# Altium footprint library Library 3D.PcbLib: 288 footprints (part 11 of 18)
Each footprint in its own frame and in the unit in brackets; x right, y up, seen from the top. Pads: shape width x height; smd on the part's side, far side on the other; paste and mask are expansions set on the pad; w line width, h text height; cw(c..) or ccw(c..) is an arc to the next point about the centre after c.
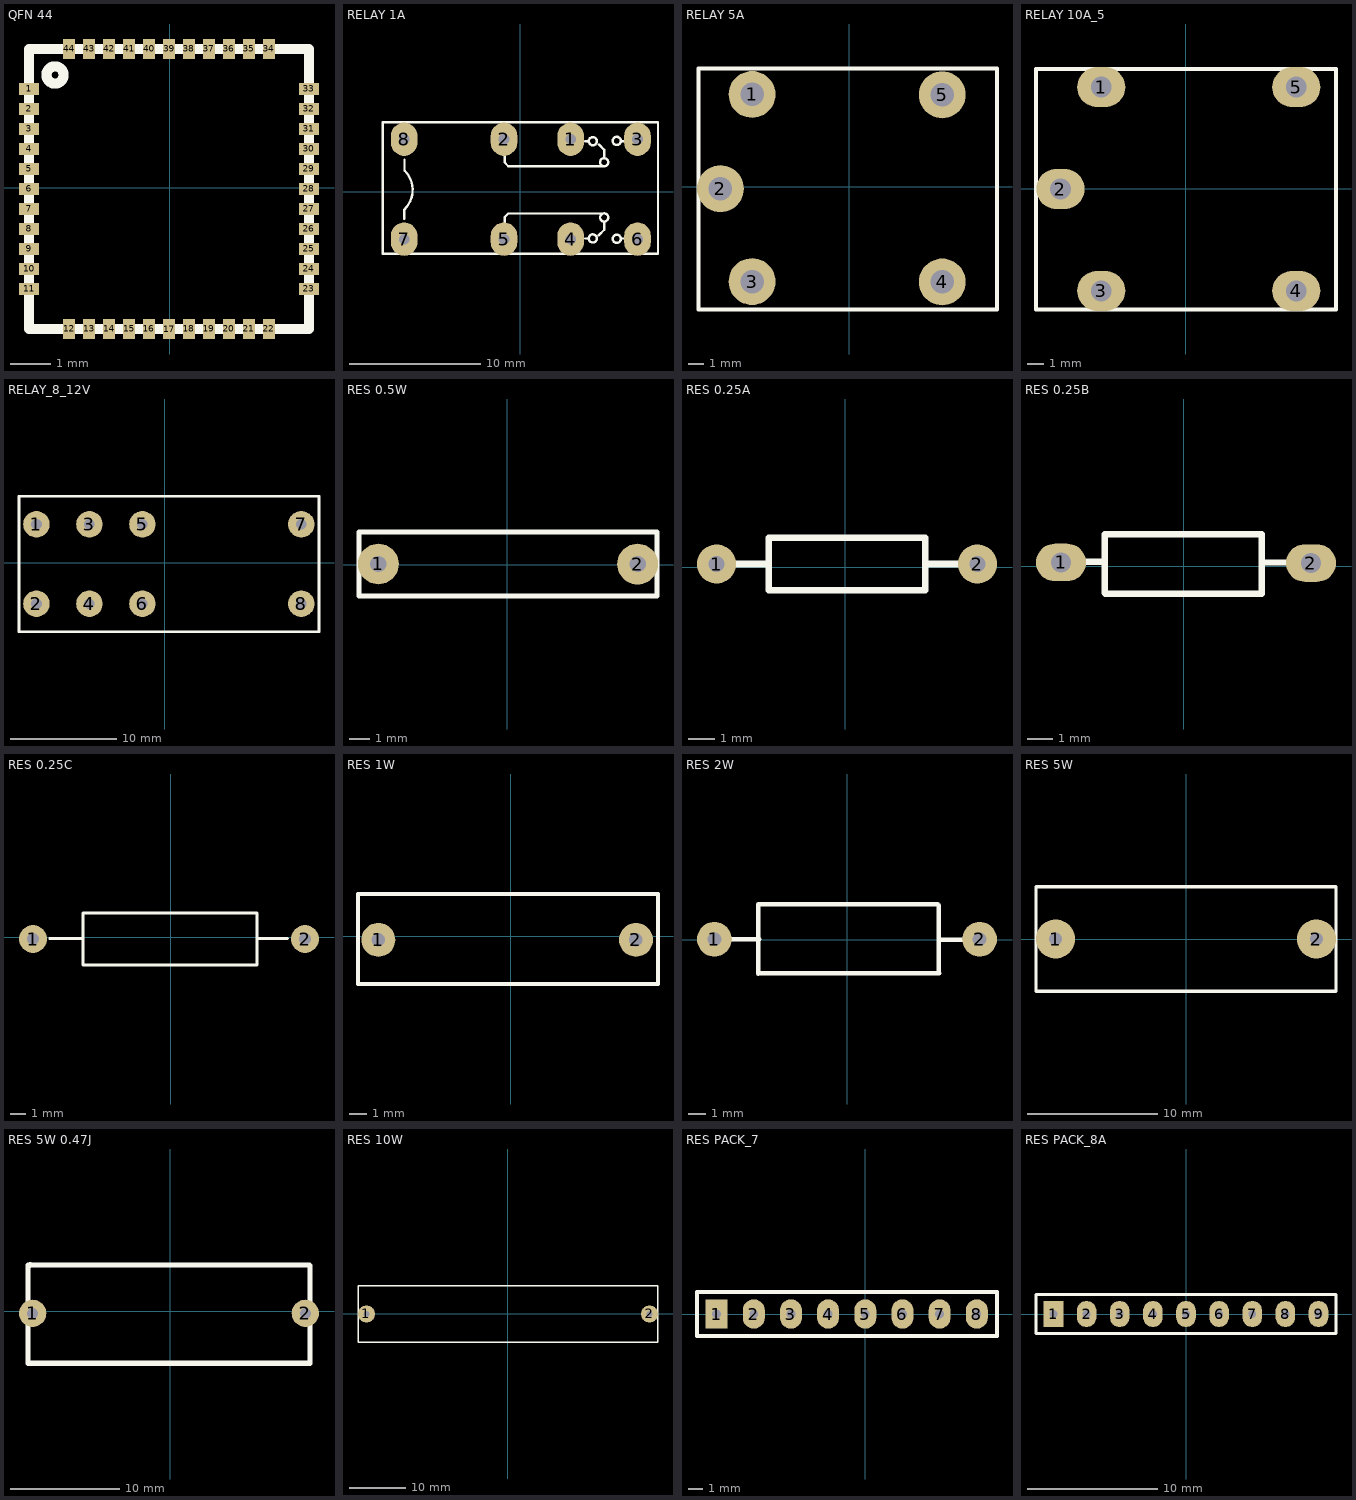
[diagram p10: the footprints below, top view; thin cyan lines are the x and y axes]

## QFN 44 [mm]
pads (44):
  rect 0.5x0.3 smd: 1(-3.525,2.475) 2(-3.525,1.975) 3(-3.525,1.475) 4(-3.525,0.975) 5(-3.525,0.475) 6(-3.525,-0.025) 7(-3.525,-0.525) 8(-3.525,-1.025) 9(-3.525,-1.525) 10(-3.525,-2.025) 11(-3.525,-2.525) 23(3.475,-2.525) 24(3.475,-2.025) 25(3.475,-1.525) 26(3.475,-1.025) 27(3.475,-0.525) 28(3.475,-0.025) 29(3.475,0.475) 30(3.475,0.975) 31(3.475,1.475) 32(3.475,1.975) 33(3.475,2.475)
  rect 0.3x0.5 smd: 12(-2.525,-3.524) 13(-2.025,-3.524) 14(-1.525,-3.525) 15(-1.025,-3.524) 16(-0.525,-3.524) 17(-0.024,-3.527) 18(0.475,-3.525) 19(0.975,-3.525) 20(1.475,-3.525) 21(1.975,-3.525) 22(2.475,-3.525) 34(2.475,3.475) 35(1.975,3.475) 36(1.475,3.475) 37(0.975,3.475) 38(0.475,3.475) 39(-0.024,3.475) 40(-0.525,3.475) 41(-1.025,3.475) 42(-1.525,3.475) 43(-2.025,3.475) 44(-2.525,3.475)
Top Overlay:
  circle w0.254: c-2.875,2.825 r0.215
  lines w0.254: -3.525,-3.527 3.477,-3.527 3.477,3.475 -3.525,3.475 -3.525,-3.527
3D body "User Library-smd_qfn-44-2.STEP": height 0.9, standoff 0, extent -3.525,-3.527 3.477,3.475

## RELAY 1A [mil]
pads (8):
  oval 80x100 hole 32: 1(150.87,157.83) 2(-49.13,157.83) 3(351.87,157.83) 4(150.87,-142.17) 5(-49.13,-142.17) 6(351.87,-142.17) 7(-349.13,-142.17) 8(-349.13,157.83)
Top Overlay:
  circle w7: c289.63,152.83 r12.24
  circle w7: c217.63,151.83 r12.24
  circle w7: c251.63,88.83 r12.24
  circle w7: c251.63,-77.17 r12.24
  circle w7: c217.63,-140.17 r12.24
  circle w7: c289.63,-141.17 r12.24
  lines w7: -349.13,-81.17 -349.13,-54.17 ; -348.13,-53.17 ccw(c-405.63,5.33) -347.13,62.83 ; -348.13,63.83 -348.13,96.83 ; -47.13,-97.17 -47.13,-76.17 -36.13,-65.17 249.87,-65.17 ; -47.13,115.83 -47.13,87.83 -36.13,76.83 249.87,76.83 ; 194.87,-140.17 202.87,-140.17 ; 194.87,151.83 202.87,151.83 ; 235.87,-130.17 251.87,-114.17 251.87,-91.17 ; 235.87,141.83 251.87,125.83 251.87,102.83 ; 303.87,-140.17 308.87,-140.17 ; 303.87,151.83 308.87,151.83 ; -413.39,-186.02 413.39,-186.02 413.39,208.83 -413.39,208.83 -413.39,-186.02
3D body "SW3dPS-DSY2Y.STEP": height 484.25, standoff -118.11, extent -408.58,-182.17 410.31,203.66

## RELAY 5A [mm]
pads (5):
  round 3 hole 1.5: 1(-6.225,5.9) 2(-8.25,-0.125) 3(-6.225,-6.075) 4(5.95,-6.1) 5(5.95,5.875)
Top Overlay:
  lines w0.254: -9.65,-7.875 9.45,-7.875 9.45,7.575 -9.65,7.575 -9.65,-7.875
3D body "User Library-SONGLE Relay SRU-12VDC-SL-C.STEP": height 15.3, standoff -5, extent -9.65,-7.875 9.45,7.625

## RELAY 10A_5 [mm]
pads (5):
  oval 3x2.5 hole 1.3: 1(-5.263,6.341) 2(-7.803,-0.009) 3(-5.263,-6.359) 4(6.897,-6.359) 5(6.897,6.341)
Top Overlay:
  lines w0.254: -9.327,-7.516 9.373,-7.516 9.373,7.484 -9.327,7.484 -9.327,-7.516
3D body: height 16, standoff 0, extent -9.327,-7.502 9.342,7.484

## RELAY_8_12V [mm]
pads (8):
  round 2.5 hole 1: 1(-12.125,3.625) 2(-12.125,-3.875) 3(-7.125,3.625) 4(-7.125,-3.875) 5(-2.125,3.625) 6(-2.125,-3.875) 7(12.875,3.625) 8(12.875,-3.875)
Top Overlay:
  lines w0.254: -13.775,-6.525 14.55,-6.525 14.55,6.275 -13.775,6.275 -13.775,-6.525
3D body "Relay8_12V.STEP": height 24.92, standoff -4.38, extent -13.625,-6.375 14.375,6.125

## RES 0.5W [mm]
pads (2):
  round 2 hole 0.8: 1(-6.325,0.025) 2(6.375,0.021)
Top Overlay:
  lines w0.254: -7.275,-1.55 7.325,-1.55 7.325,1.6 -7.275,1.6 -7.275,-1.55
3D body "User Library-Resistencia 0_5.STEP": height 3.1, standoff -1.5, extent -6.706,-1.407 6.756,1.45

## RES 0.25A [mm]
pads (2):
  round 1.5 hole 0.6: 1(-4.925,0.125) 2(5.075,0.125)
Top Overlay:
  lines w0.254: -4.925,0.125 -2.925,0.125 ; 3.075,0.125 5.075,0.125 ; -2.925,-0.875 -2.925,1.125 3.075,1.125 3.075,-0.875 -2.925,-0.875
3D body "R 0.25W.STEP": height 7.8, standoff -3.5, extent -5.225,-1.185 5.375,1.425

## RES 0.25B [mm]
pads (2):
  oval 2x1.5 hole 0.8: 1(-4.9,0.15) 2(5.1,0.125)
Top Overlay:
  lines w0.254: -4.525,0.175 -3.15,0.175 ; 3.187,0.15 4.7,0.15 ; -3.15,-1.075 -3.125,-1.1 3.125,-1.1 3.125,1.275 -3.15,1.275 -3.15,-1.075
3D body "SW3dPS-AXIAL_RESISTOR(0.25W).STEP": height 2.6, standoff -1.5, extent -5.295,-1.1 5.505,1.3

## RES 0.25C [mil]
pads (2):
  round 70 hole 31: 1(-344.13,-4.72) 2(335.87,-4.72)
Top Overlay:
  lines w7: -302.13,-3.72 -219.13,-3.72 ; 215.87,-3.72 291.87,-3.72 ; -219.13,-69.72 215.87,-69.72 215.87,60.28 -219.13,60.28 -219.13,-69.72
3D body "SW3dPS-Resistor 5-band.STEP": height 142, standoff -125, extent -354.88,-69.72 346.62,62.28

## RES 1W [mm]
pads (2):
  round 2 hole 0.8: 1(-7.8,-0.2) 2(7.4,-0.2)
Top Overlay:
  lines w0.254: -9,-2.8 -9,2.5 8.7,2.5 8.7,-2.8 -9,-2.8
3D body "User Library-RES-1W.STEP": height 5, standoff -3, extent -8.15,-2.703 7.79,2.297

## RES 2W [mm]
pads (2):
  round 2 hole 0.8: 1(-7.65,0.025) 2(7.6,0.025)
Top Overlay:
  lines w0.254: -6.975,0.025 -5.075,0.025 ; 5.3,0 6.725,0 ; -5.125,-1.95 -5.125,2.025 5.2,2.025 5.25,1.975 5.25,-1.9 5.275,-1.925 -5.1,-1.925 -5.125,-1.95
3D body "User Library-Resistor_Carvao_2W.STEP": height 5, standoff -3, extent -8.045,-1.975 7.995,2.025

## RES 5W [mm]
pads (2):
  round 3 hole 1: 1(-10,0) 2(10,0)
Top Overlay:
  lines w0.254: -11.5,-4 -11.5,4 11.5,4 11.5,-4 -11.5,-4
3D body "User Library-Resistor_PTH_AC05_Vishay_5W.STEP": height 7.5, standoff -2.6, extent -10.4,-3.75 10.4,3.75

## RES 5W 0.47J [mm]
pads (2):
  round 2.5 hole 1: 1(-12.625,-0.2) 2(12.375,-0.2)
Top Overlay:
  lines w0.5: -13.021,4.232 12.718,4.232 12.8,4.15 12.8,-4.747 12.779,-4.768 -13.05,-4.768 -13.05,4.05 -12.85,4.25
3D body "Trodrhdh.STEP": height 9.21, standoff -5.33, extent -13.021,-4.768 12.779,4.232

## RES 10W [mm]
pads (2):
  round 3 hole 1: 1(-25,0) 2(25,0)
Top Overlay:
  lines w0.254: -26.5,-5 -26.5,5 26.5,5 26.5,-5 26,-5 -26.5,-5
3D body "User Library-Resistor_PTH_RS010_Vishay_10W.STEP": height 9.53, standoff -2.6, extent -25.5,-4.765 25.5,4.765

## RES PACK_7 [mm]
pads (8):
  rect 1.5x2 hole 0.6: 1(-10.16,0)
  oval 1.5x2 hole 0.6: 2(-7.62,0) 3(-5.08,0) 4(-2.54,0) 5(0,0) 6(2.54,0) 7(5.08,0) 8(7.62,0)
Top Overlay:
  lines w0.254: -11.5,-1.5 -11.5,1.5 9,1.5 9,-1.5 -11.5,-1.5
3D body "User Library-4600H Series (Bourns).STEP": height 9.01, standoff -3.18, extent -11.354,-1.245 8.916,1.245

## RES PACK_8A [mm]
pads (9):
  rect 1.5x2 hole 0.6: 1(-10.16,0)
  oval 1.5x2 hole 0.6: 2(-7.62,0) 3(-5.08,0) 4(-2.54,0) 5(0,0) 6(2.54,0) 7(5.08,0) 8(7.62,0) 9(10.16,0)
Top Overlay:
  lines w0.254: -11.5,-1.5 11.5,-1.5 11.5,1.5 -11.5,1.5 -11.5,-1.5
3D body "User Library-Resistor Pack 8.STEP": height 4.93, standoff -3.5, extent -11.405,-1.225 11.405,1.275